# Altium footprint library ref-packages-longpad.PCBLIB: 1527 footprints (part 96 of 103)
Each footprint in its own frame and in the unit in brackets; x right, y up, seen from the top. Pads: shape width x height; smd on the part's side, far side on the other; paste and mask are expansions set on the pad; w line width, h text height; cw(c..) or ccw(c..) is an arc to the next point about the centre after c.
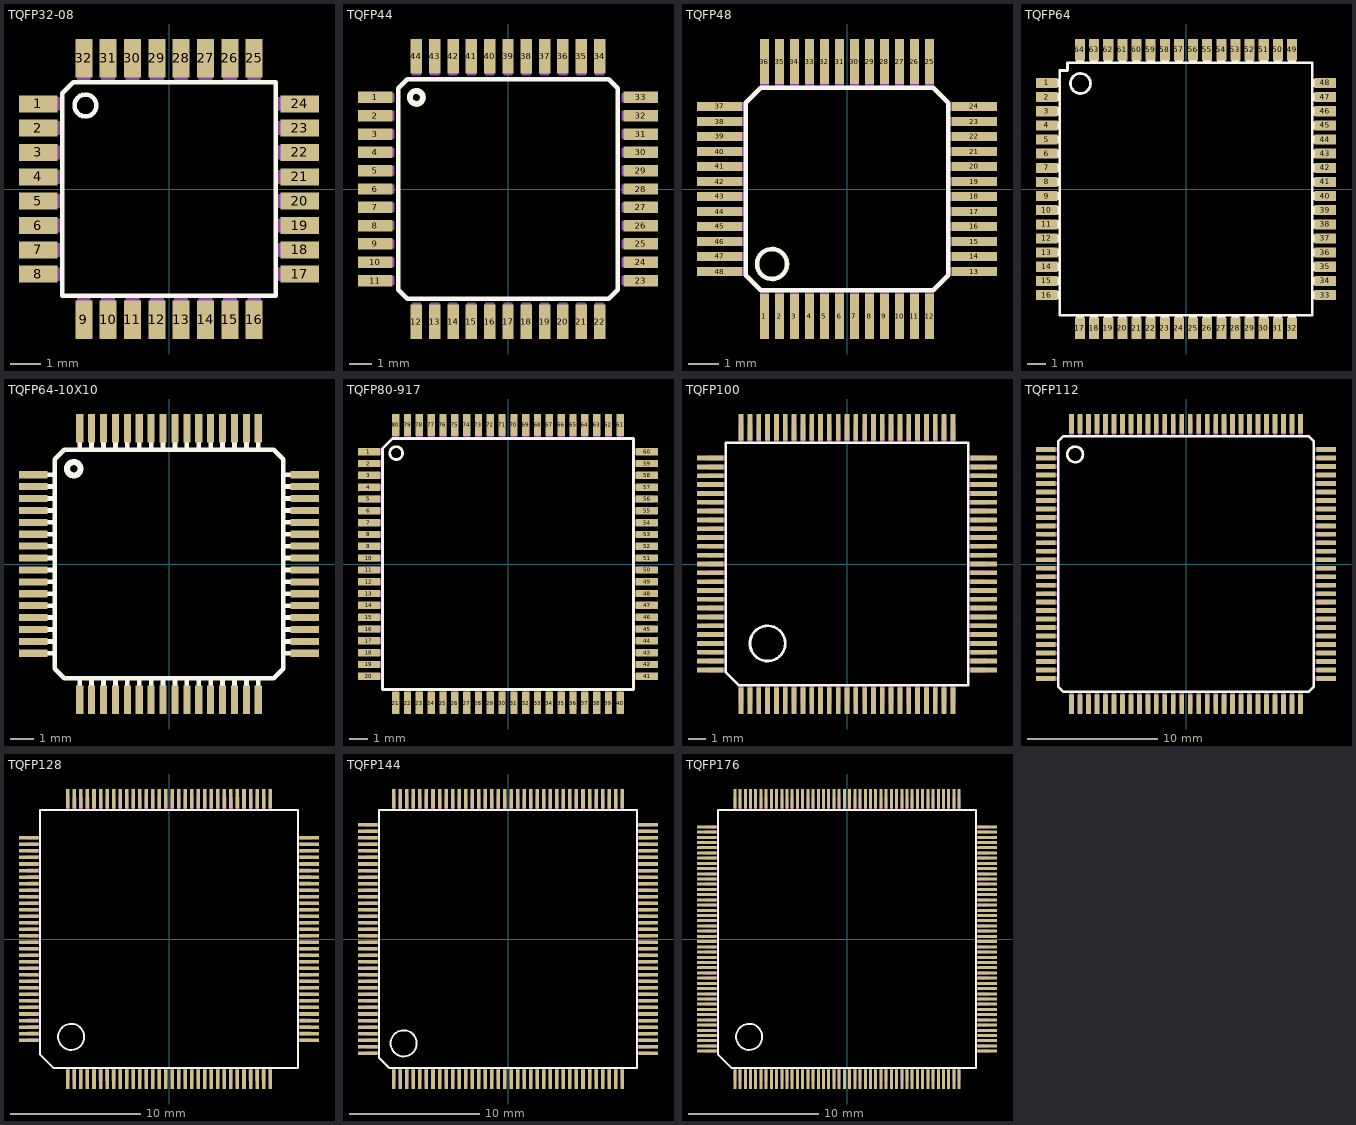
[diagram p95: the footprints below, top view; thin cyan lines are the x and y axes]

## TQFP32-08 [mil]
pads (32):
  rect 50x22 smd: 1(-169,110.24) 2(-169,78.74) 3(-169,47.24) 4(-169,15.75) 5(-169,-15.75) 6(-169,-47.24) 7(-169,-78.74) 8(-169,-110.24) 17(169,-110.24) 18(169,-78.74) 19(169,-47.24) 20(169,-15.75) 21(169,15.75) 22(169,47.24) 23(169,78.74) 24(169,110.24)
  rect 22x50 smd: 9(-110.24,-169) 10(-78.74,-169) 11(-47.24,-169) 12(-15.75,-169) 13(15.75,-169) 14(47.24,-169) 15(78.74,-169) 16(110.24,-169) 25(110.24,169) 26(78.74,169) 27(47.24,169) 28(15.75,169) 29(-15.75,169) 30(-47.24,169) 31(-78.74,169) 32(-110.24,169)
Top Overlay:
  circle w6: c-108,108 r14.14
  lines w6: -137.99,-137.99 137.99,-137.99 137.99,137.99 -124.02,137.99 -137.99,124.02 -137.99,-137.99
Mechanical 16:
  rectangle: -179,101.24 -140,119.24
  rectangle: -179,69.74 -140,87.74
  rectangle: -179,38.24 -140,56.24
  rectangle: -179,6.75 -140,24.75
  rectangle: -179,-24.75 -140,-6.75
  rectangle: -179,-56.24 -140,-38.24
  rectangle: -179,-87.74 -140,-69.74
  rectangle: -179,-119.24 -140,-101.24
  rectangle: -119.24,-179 -101.24,-140
  rectangle: -87.74,-179 -69.74,-140
  rectangle: -56.24,-179 -38.24,-140
  rectangle: -24.75,-179 -6.75,-140
  rectangle: 6.75,-179 24.75,-140
  rectangle: 38.24,-179 56.24,-140
  rectangle: 69.74,-179 87.74,-140
  rectangle: 101.24,-179 119.24,-140
  rectangle: 140,-119.24 179,-101.24
  rectangle: 140,-87.74 179,-69.74
  rectangle: 140,-56.24 179,-38.24
  rectangle: 140,-24.75 179,-6.75
  rectangle: 140,6.75 179,24.75
  rectangle: 140,38.24 179,56.24
  rectangle: 140,69.74 179,87.74
  rectangle: 140,101.24 179,119.24
  rectangle: 101.24,140 119.24,179
  rectangle: 69.74,140 87.74,179
  rectangle: 38.24,140 56.24,179
  rectangle: 6.75,140 24.75,179
  rectangle: -24.75,140 -6.75,179
  rectangle: -56.24,140 -38.24,179
  rectangle: -87.74,140 -69.74,179
  rectangle: -119.24,140 -101.24,179

## TQFP44 [mil]
pads (44):
  rect 59.06x19.69 smd: 1(-228.35,157.48) 2(-228.35,125.98) 3(-228.35,94.49) 4(-228.35,62.99) 5(-228.35,31.5) 6(-228.35,0) 7(-228.35,-31.5) 8(-228.35,-62.99) 9(-228.35,-94.49) 10(-228.35,-125.98) 11(-228.35,-157.48) 23(228.35,-157.48) 24(228.35,-125.98) 25(228.35,-94.49) 26(228.35,-62.99) 27(228.35,-31.5) 28(228.35,0) 29(228.35,31.5) 30(228.35,62.99) 31(228.35,94.49) 32(228.35,125.98) 33(228.35,157.48)
  rect 19.69x59.06 smd: 12(-157.48,-228.35) 13(-125.98,-228.35) 14(-94.49,-228.35) 15(-62.99,-228.35) 16(-31.5,-228.35) 17(0,-228.35) 18(31.5,-228.35) 19(62.99,-228.35) 20(94.49,-228.35) 21(125.98,-228.35) 22(157.48,-228.35) 34(157.48,228.35) 35(125.98,228.35) 36(94.49,228.35) 37(62.99,228.35) 38(31.5,228.35) 39(0,228.35) 40(-31.5,228.35) 41(-62.99,228.35) 42(-94.49,228.35) 43(-125.98,228.35) 44(-157.48,228.35)
Top Overlay:
  circle w10: c-157.48,157.48 r11.13
  lines w8: -188.98,-173.23 -173.23,-188.98 173.23,-188.98 188.98,-173.23 188.98,173.23 173.23,188.98 -173.23,188.98 -188.98,173.23 -188.98,-173.23
Mechanical 16:
  rectangle: -240.16,149.61 -194.88,165.35
  rectangle: -240.16,118.11 -194.88,133.86
  rectangle: -240.16,86.61 -194.88,102.36
  rectangle: -240.16,55.12 -194.88,70.87
  rectangle: -240.16,23.62 -194.88,39.37
  rectangle: -240.16,-7.87 -194.88,7.87
  rectangle: -240.16,-39.37 -194.88,-23.62
  rectangle: -240.16,-70.87 -194.88,-55.12
  rectangle: -240.16,-102.36 -194.88,-86.61
  rectangle: -240.16,-133.86 -194.88,-118.11
  rectangle: -240.16,-165.35 -194.88,-149.61
  rectangle: -165.35,-240.16 -149.61,-194.88
  rectangle: -133.86,-240.16 -118.11,-194.88
  rectangle: -102.36,-240.16 -86.61,-194.88
  rectangle: -70.87,-240.16 -55.12,-194.88
  rectangle: -39.37,-240.16 -23.62,-194.88
  rectangle: -7.87,-240.16 7.87,-194.88
  rectangle: 23.62,-240.16 39.37,-194.88
  rectangle: 55.12,-240.16 70.87,-194.88
  rectangle: 86.61,-240.16 102.36,-194.88
  rectangle: 118.11,-240.16 133.86,-194.88
  rectangle: 149.61,-240.16 165.35,-194.88
  rectangle: 194.88,-165.35 240.16,-149.61
  rectangle: 194.88,-133.86 240.16,-118.11
  rectangle: 194.88,-102.36 240.16,-86.61
  rectangle: 194.88,-70.87 240.16,-55.12
  rectangle: 194.88,-39.37 240.16,-23.62
  rectangle: 194.88,-7.87 240.16,7.87
  rectangle: 194.88,23.62 240.16,39.37
  rectangle: 194.88,55.12 240.16,70.87
  rectangle: 194.88,86.61 240.16,102.36
  rectangle: 194.88,118.11 240.16,133.86
  rectangle: 194.88,149.61 240.16,165.35
  rectangle: 149.61,194.88 165.35,240.16
  rectangle: 118.11,194.88 133.86,240.16
  rectangle: 86.61,194.88 102.36,240.16
  rectangle: 55.12,194.88 70.87,240.16
  rectangle: 23.62,194.88 39.37,240.16
  rectangle: -7.87,194.88 7.87,240.16
  rectangle: -39.37,194.88 -23.62,240.16
  rectangle: -70.87,194.88 -55.12,240.16
  rectangle: -102.36,194.88 -86.61,240.16
  rectangle: -133.86,194.88 -118.11,240.16
  rectangle: -165.35,194.88 -149.61,240.16

## TQFP48 [mil]
pads (48):
  rect 11.81x59.06 smd: 1(-108.27,-167.32) 2(-88.58,-167.32) 3(-68.9,-167.32) 4(-49.21,-167.32) 5(-29.53,-167.32) 6(-9.84,-167.32) 7(9.84,-167.32) 8(29.53,-167.32) 9(49.21,-167.32) 10(68.9,-167.32) 11(88.58,-167.32) 12(108.27,-167.32) 25(108.27,167.32) 26(88.58,167.32) 27(68.9,167.32) 28(49.21,167.32) 29(29.53,167.32) 30(9.84,167.32) 31(-9.84,167.32) 32(-29.53,167.32) 33(-49.21,167.32) 34(-68.9,167.32) 35(-88.58,167.32) 36(-108.27,167.32)
  rect 59.06x11.81 smd: 13(167.32,-108.27) 14(167.32,-88.58) 15(167.32,-68.9) 16(167.32,-49.21) 17(167.32,-29.53) 18(167.32,-9.84) 19(167.32,9.84) 20(167.32,29.53) 21(167.32,49.21) 22(167.32,68.9) 23(167.32,88.58) 24(167.32,108.27) 37(-167.32,108.27) 38(-167.32,88.58) 39(-167.32,68.9) 40(-167.32,49.21) 41(-167.32,29.53) 42(-167.32,9.84) 43(-167.32,-9.84) 44(-167.32,-29.53) 45(-167.32,-49.21) 46(-167.32,-68.9) 47(-167.32,-88.58) 48(-167.32,-108.27)
Top Overlay:
  circle w6: c-98.43,-98.43 r19.69
  lines w6: -132.8,-113.11 -113.11,-132.8 113.11,-132.8 132.8,-113.11 132.8,113.11 113.11,132.8 -113.11,132.8 -132.8,113.11 -132.8,-113.11
Mechanical 16:
  rectangle: -114.17,132.8 -102.36,172.17
  rectangle: -94.49,132.8 -82.68,172.17
  rectangle: -74.8,132.8 -62.99,172.17
  rectangle: -55.12,132.8 -43.31,172.17
  rectangle: -35.43,132.8 -23.62,172.17
  rectangle: -15.75,132.8 -3.94,172.17
  rectangle: 3.94,132.8 15.75,172.17
  rectangle: 23.62,132.8 35.43,172.17
  rectangle: 43.31,132.8 55.12,172.17
  rectangle: 62.99,132.8 74.8,172.17
  rectangle: 82.68,132.8 94.49,172.17
  rectangle: 102.36,132.8 114.17,172.17
  rectangle: 132.8,102.36 172.17,114.17
  rectangle: 132.8,82.68 172.17,94.49
  rectangle: 132.8,62.99 172.17,74.8
  rectangle: 132.8,43.31 172.17,55.12
  rectangle: 132.8,23.62 172.17,35.43
  rectangle: 132.8,3.94 172.17,15.75
  rectangle: 132.8,-15.75 172.17,-3.94
  rectangle: 132.8,-35.43 172.17,-23.62
  rectangle: 132.8,-55.12 172.17,-43.31
  rectangle: 132.8,-74.8 172.17,-62.99
  rectangle: 132.8,-94.49 172.17,-82.68
  rectangle: 132.8,-114.17 172.17,-102.36
  rectangle: 102.36,-172.17 114.17,-132.8
  rectangle: 82.68,-172.17 94.49,-132.8
  rectangle: 62.99,-172.17 74.8,-132.8
  rectangle: 43.31,-172.17 55.12,-132.8
  rectangle: 23.62,-172.17 35.43,-132.8
  rectangle: 3.94,-172.17 15.75,-132.8
  rectangle: -15.75,-172.17 -3.94,-132.8
  rectangle: -35.43,-172.17 -23.62,-132.8
  rectangle: -55.12,-172.17 -43.31,-132.8
  rectangle: -74.8,-172.17 -62.99,-132.8
  rectangle: -94.49,-172.17 -82.68,-132.8
  rectangle: -114.17,-172.17 -102.36,-132.8
  rectangle: -172.17,-114.17 -132.8,-102.36
  rectangle: -172.17,-94.49 -132.8,-82.68
  rectangle: -172.17,-55.12 -132.8,-43.31
  rectangle: -172.17,-74.8 -132.8,-62.99
  rectangle: -172.17,-15.75 -132.8,-3.94
  rectangle: -172.17,-35.43 -132.8,-23.62
  rectangle: -172.17,23.62 -132.8,35.43
  rectangle: -172.17,3.94 -132.8,15.75
  rectangle: -172.17,62.99 -132.8,74.8
  rectangle: -172.17,43.31 -132.8,55.12
  rectangle: -172.17,82.68 -132.8,94.49
  rectangle: -172.17,102.36 -132.8,114.17

## TQFP64 [mil]
pads (64):
  rect 47x22 smd: 1(-305.5,232.5) 2(-305.5,201.5) 3(-305.5,170.5) 4(-305.5,139.5) 5(-305.5,108.5) 6(-305.5,77.5) 7(-305.5,46.5) 8(-305.5,15.5) 9(-305.5,-15.5) 10(-305.5,-46.5) 11(-305.5,-77.5) 12(-305.5,-108.5) 13(-305.5,-139.5) 14(-305.5,-170.5) 15(-305.5,-201.5) 16(-305.5,-232.5) 33(305.5,-232.5) 34(305.5,-201.5) 35(305.5,-170.5) 36(305.5,-139.5) 37(305.5,-108.5) 38(305.5,-77.5) 39(305.5,-46.5) 40(305.5,-15.5) 41(305.5,15.5) 42(305.5,46.5) 43(305.5,77.5) 44(305.5,108.5) 45(305.5,139.5) 46(305.5,170.5) 47(305.5,201.5) 48(305.5,232.5)
  rect 22x47 smd: 17(-232.5,-305.5) 18(-201.5,-305.5) 19(-170.5,-305.5) 20(-139.5,-305.5) 21(-108.5,-305.5) 22(-77.5,-305.5) 23(-46.5,-305.5) 24(-15.5,-305.5) 25(15.5,-305.5) 26(46.5,-305.5) 27(77.5,-305.5) 28(108.5,-305.5) 29(139.5,-305.5) 30(170.5,-305.5) 31(201.5,-305.5) 32(232.5,-305.5) 49(232.5,305.5) 50(201.5,305.5) 51(170.5,305.5) 52(139.5,305.5) 53(108.5,305.5) 54(77.5,305.5) 55(46.5,305.5) 56(15.5,305.5) 57(-15.5,305.5) 58(-46.5,305.5) 59(-77.5,305.5) 60(-108.5,305.5) 61(-139.5,305.5) 62(-170.5,305.5) 63(-201.5,305.5) 64(-232.5,305.5)
Top Overlay:
  circle w6: c-231.5,231.5 r22
  rectangle: 279,6.5 322,24.5
  rectangle: 279,37.5 322,55.5
  rectangle: 279,68.5 322,86.5
  rectangle: 279,99.5 322,117.5
  rectangle: 279,130.5 322,148.5
  rectangle: 279,161.5 322,179.5
  rectangle: 279,192.5 322,210.5
  rectangle: 279,223.5 322,241.5
  rectangle: 279,-24.5 322,-6.5
  rectangle: 279,-55.5 322,-37.5
  rectangle: 279,-86.5 322,-68.5
  rectangle: 279,-117.5 322,-99.5
  rectangle: 279,-148.5 322,-130.5
  rectangle: 279,-179.5 322,-161.5
  rectangle: 279,-210.5 322,-192.5
  rectangle: 279,-241.5 322,-223.5
  rectangle: 6.5,-322 24.5,-279
  rectangle: 37.5,-322 55.5,-279
  rectangle: 68.5,-322 86.5,-279
  rectangle: 99.5,-322 117.5,-279
  rectangle: 130.5,-322 148.5,-279
  rectangle: 161.5,-322 179.5,-279
  rectangle: 192.5,-322 210.5,-279
  rectangle: 223.5,-322 241.5,-279
  rectangle: -24.5,-322 -6.5,-279
  rectangle: -55.5,-322 -37.5,-279
  rectangle: -86.5,-322 -68.5,-279
  rectangle: -117.5,-322 -99.5,-279
  rectangle: -148.5,-322 -130.5,-279
  rectangle: -179.5,-322 -161.5,-279
  rectangle: -210.5,-322 -192.5,-279
  rectangle: -241.5,-322 -223.5,-279
  rectangle: -322,-24.5 -279,-6.5
  rectangle: -322,-55.5 -279,-37.5
  rectangle: -322,-86.5 -279,-68.5
  rectangle: -322,-117.5 -279,-99.5
  rectangle: -322,-148.5 -279,-130.5
  rectangle: -322,-179.5 -279,-161.5
  rectangle: -322,-210.5 -279,-192.5
  rectangle: -322,-241.5 -279,-223.5
  rectangle: -322,6.5 -279,24.5
  rectangle: -322,37.5 -279,55.5
  rectangle: -322,68.5 -279,86.5
  rectangle: -322,99.5 -279,117.5
  rectangle: -322,130.5 -279,148.5
  rectangle: -322,161.5 -279,179.5
  rectangle: -322,192.5 -279,210.5
  rectangle: -322,223.5 -279,241.5
  rectangle: -24.5,279 -6.5,322
  rectangle: -55.5,279 -37.5,322
  rectangle: -86.5,279 -68.5,322
  rectangle: -117.5,279 -99.5,322
  rectangle: -148.5,279 -130.5,322
  rectangle: -179.5,279 -161.5,322
  rectangle: -210.5,279 -192.5,322
  rectangle: -241.5,279 -223.5,322
  rectangle: 6.5,279 24.5,322
  rectangle: 37.5,279 55.5,322
  rectangle: 68.5,279 86.5,322
  rectangle: 99.5,279 117.5,322
  rectangle: 130.5,279 148.5,322
  rectangle: 161.5,279 179.5,322
  rectangle: 192.5,279 210.5,322
  rectangle: 223.5,279 241.5,322
  lines w6: -277,-277 277,-277 277,277 -260,277 -260,260 -277,260 -277,-277

## TQFP64-10X10 [mm]
pads (64):
  rect 1.2x0.3 smd: 1(-5.7,3.75) 2(-5.7,3.25) 3(-5.7,2.75) 4(-5.7,2.25) 5(-5.7,1.75) 6(-5.7,1.25) 7(-5.7,0.75) 8(-5.7,0.25) 9(-5.7,-0.25) 10(-5.7,-0.75) 11(-5.7,-1.25) 12(-5.7,-1.75) 13(-5.7,-2.25) 14(-5.7,-2.75) 15(-5.7,-3.25) 16(-5.7,-3.75) 33(5.7,-3.75) 34(5.7,-3.25) 35(5.7,-2.75) 36(5.7,-2.25) 37(5.7,-1.75) 38(5.7,-1.25) 39(5.7,-0.75) 40(5.7,-0.25) 41(5.7,0.25) 42(5.7,0.75) 43(5.7,1.25) 44(5.7,1.75) 45(5.7,2.25) 46(5.7,2.75) 47(5.7,3.25) 48(5.7,3.75)
  rect 0.3x1.2 smd: 17(-3.75,-5.7) 18(-3.25,-5.7) 19(-2.75,-5.7) 20(-2.25,-5.7) 21(-1.75,-5.7) 22(-1.25,-5.7) 23(-0.75,-5.7) 24(-0.25,-5.7) 25(0.25,-5.7) 26(0.75,-5.7) 27(1.25,-5.7) 28(1.75,-5.7) 29(2.25,-5.7) 30(2.75,-5.7) 31(3.25,-5.7) 32(3.75,-5.7) 49(3.75,5.7) 50(3.25,5.7) 51(2.75,5.7) 52(2.25,5.7) 53(1.75,5.7) 54(1.25,5.7) 55(0.75,5.7) 56(0.25,5.7) 57(-0.25,5.7) 58(-0.75,5.7) 59(-1.25,5.7) 60(-1.75,5.7) 61(-2.25,5.7) 62(-2.75,5.7) 63(-3.25,5.7) 64(-3.75,5.7)
Top Overlay:
  circle w0.254: c-4,4 r0.283
  rectangle: -6,3.65 -4.8,3.85
  rectangle: -6,3.15 -4.8,3.35
  rectangle: -6,2.65 -4.8,2.85
  rectangle: -6,2.15 -4.8,2.35
  rectangle: -6,1.65 -4.8,1.85
  rectangle: -6,1.15 -4.8,1.35
  rectangle: -6,0.65 -4.8,0.85
  rectangle: -6,0.15 -4.8,0.35
  rectangle: -6,-0.35 -4.8,-0.15
  rectangle: -6,-0.85 -4.8,-0.65
  rectangle: -6,-1.35 -4.8,-1.15
  rectangle: -6,-1.85 -4.8,-1.65
  rectangle: -6,-2.35 -4.8,-2.15
  rectangle: -6,-2.85 -4.8,-2.65
  rectangle: -6,-3.35 -4.8,-3.15
  rectangle: -6,-3.85 -4.8,-3.65
  rectangle: -3.85,-6 -3.65,-4.8
  rectangle: -3.35,-6 -3.15,-4.8
  rectangle: -2.85,-6 -2.65,-4.8
  rectangle: -2.35,-6 -2.15,-4.8
  rectangle: -1.85,-6 -1.65,-4.8
  rectangle: -1.35,-6 -1.15,-4.8
  rectangle: -0.85,-6 -0.65,-4.8
  rectangle: -0.35,-6 -0.15,-4.8
  rectangle: 0.15,-6 0.35,-4.8
  rectangle: 0.65,-6 0.85,-4.8
  rectangle: 1.15,-6 1.35,-4.8
  rectangle: 1.65,-6 1.85,-4.8
  rectangle: 2.15,-6 2.35,-4.8
  rectangle: 2.65,-6 2.85,-4.8
  rectangle: 3.15,-6 3.35,-4.8
  rectangle: 3.65,-6 3.85,-4.8
  rectangle: 4.8,-3.85 6,-3.65
  rectangle: 4.8,-3.35 6,-3.15
  rectangle: 4.8,-2.85 6,-2.65
  rectangle: 4.8,-2.35 6,-2.15
  rectangle: 4.8,-1.85 6,-1.65
  rectangle: 4.8,-1.35 6,-1.15
  rectangle: 4.8,-0.85 6,-0.65
  rectangle: 4.8,-0.35 6,-0.15
  rectangle: 4.8,0.15 6,0.35
  rectangle: 4.8,0.65 6,0.85
  rectangle: 4.8,1.15 6,1.35
  rectangle: 4.8,1.65 6,1.85
  rectangle: 4.8,2.15 6,2.35
  rectangle: 4.8,2.65 6,2.85
  rectangle: 4.8,3.15 6,3.35
  rectangle: 4.8,3.65 6,3.85
  rectangle: 3.65,4.8 3.85,6
  rectangle: 3.15,4.8 3.35,6
  rectangle: 2.65,4.8 2.85,6
  rectangle: 2.15,4.8 2.35,6
  rectangle: 1.65,4.8 1.85,6
  rectangle: 1.15,4.8 1.35,6
  rectangle: 0.65,4.8 0.85,6
  rectangle: 0.15,4.8 0.35,6
  rectangle: -0.35,4.8 -0.15,6
  rectangle: -0.85,4.8 -0.65,6
  rectangle: -1.35,4.8 -1.15,6
  rectangle: -1.85,4.8 -1.65,6
  rectangle: -2.35,4.8 -2.15,6
  rectangle: -2.85,4.8 -2.65,6
  rectangle: -3.35,4.8 -3.15,6
  rectangle: -3.85,4.8 -3.65,6
  lines w0.203: -4.8,-4.4 -4.4,-4.8 4.4,-4.8 4.8,-4.4 4.8,4.4 4.4,4.8 -4.4,4.8 -4.8,4.4 -4.8,-4.4

## TQFP80-917 [mm]
pads (80):
  rect 1.2x0.4 smd: 1(-7.65,6.175) 2(-7.65,5.525) 3(-7.65,4.875) 4(-7.65,4.225) 5(-7.65,3.575) 6(-7.65,2.925) 7(-7.65,2.275) 8(-7.65,1.625) 9(-7.65,0.975) 10(-7.65,0.325) 11(-7.65,-0.325) 12(-7.65,-0.975) 13(-7.65,-1.625) 14(-7.65,-2.275) 15(-7.65,-2.925) 16(-7.65,-3.575) 17(-7.65,-4.225) 18(-7.65,-4.875) 19(-7.65,-5.525) 20(-7.65,-6.175) 41(7.65,-6.175) 42(7.65,-5.525) 43(7.65,-4.875) 44(7.65,-4.225) 45(7.65,-3.575) 46(7.65,-2.925) 47(7.65,-2.275) 48(7.65,-1.625) 49(7.65,-0.975) 50(7.65,-0.325) 51(7.65,0.325) 52(7.65,0.975) 53(7.65,1.625) 54(7.65,2.275) 55(7.65,2.925) 56(7.65,3.575) 57(7.65,4.225) 58(7.65,4.875) 59(7.65,5.525) 60(7.65,6.175)
  rect 0.4x1.2 smd: 21(-6.175,-7.65) 22(-5.525,-7.65) 23(-4.875,-7.65) 24(-4.225,-7.65) 25(-3.575,-7.65) 26(-2.925,-7.65) 27(-2.275,-7.65) 28(-1.625,-7.65) 29(-0.975,-7.65) 30(-0.325,-7.65) 31(0.325,-7.65) 32(0.975,-7.65) 33(1.625,-7.65) 34(2.275,-7.65) 35(2.925,-7.65) 36(3.575,-7.65) 37(4.225,-7.65) 38(4.875,-7.65) 39(5.525,-7.65) 40(6.175,-7.65) 61(6.175,7.65) 62(5.525,7.65) 63(4.875,7.65) 64(4.225,7.65) 65(3.575,7.65) 66(2.925,7.65) 67(2.275,7.65) 68(1.625,7.65) 69(0.975,7.65) 70(0.325,7.65) 71(-0.325,7.65) 72(-0.975,7.65) 73(-1.625,7.65) 74(-2.275,7.65) 75(-2.925,7.65) 76(-3.575,7.65) 77(-4.225,7.65) 78(-4.875,7.65) 79(-5.525,7.65) 80(-6.175,7.65)
Top Overlay:
  circle w0.152: c-6.15,6.1 r0.354
  lines w0.152: -6.9,-6.9 6.9,-6.9 6.9,6.9 -6.35,6.9 -6.9,6.35 -6.9,-6.9
Mechanical 16:
  rectangle: -8,5.995 -6.94,6.355
  rectangle: -8,5.345 -6.94,5.705
  rectangle: -8,4.695 -6.94,5.055
  rectangle: -8,4.045 -6.94,4.405
  rectangle: -8,3.395 -6.94,3.755
  rectangle: -8,2.745 -6.94,3.105
  rectangle: -8,2.095 -6.94,2.455
  rectangle: -8,1.445 -6.94,1.805
  rectangle: -8,0.795 -6.94,1.155
  rectangle: -8,0.145 -6.94,0.505
  rectangle: -8,-0.505 -6.94,-0.145
  rectangle: -8,-1.155 -6.94,-0.795
  rectangle: -8,-1.805 -6.94,-1.445
  rectangle: -8,-2.455 -6.94,-2.095
  rectangle: -8,-3.105 -6.94,-2.745
  rectangle: -8,-3.755 -6.94,-3.395
  rectangle: -8,-4.405 -6.94,-4.045
  rectangle: -8,-5.055 -6.94,-4.695
  rectangle: -8,-5.705 -6.94,-5.345
  rectangle: -8,-6.355 -6.94,-5.995
  rectangle: -6.355,-8 -5.995,-6.94
  rectangle: -5.705,-8 -5.345,-6.94
  rectangle: -5.055,-8 -4.695,-6.94
  rectangle: -4.405,-8 -4.045,-6.94
  rectangle: -3.755,-8 -3.395,-6.94
  rectangle: -3.105,-8 -2.745,-6.94
  rectangle: -2.455,-8 -2.095,-6.94
  rectangle: -1.805,-8 -1.445,-6.94
  rectangle: -1.155,-8 -0.795,-6.94
  rectangle: -0.505,-8 -0.145,-6.94
  rectangle: 0.145,-8 0.505,-6.94
  rectangle: 0.795,-8 1.155,-6.94
  rectangle: 1.445,-8 1.805,-6.94
  rectangle: 2.095,-8 2.455,-6.94
  rectangle: 2.745,-8 3.105,-6.94
  rectangle: 3.395,-8 3.755,-6.94
  rectangle: 4.045,-8 4.405,-6.94
  rectangle: 4.695,-8 5.055,-6.94
  rectangle: 5.345,-8 5.705,-6.94
  rectangle: 5.995,-8 6.355,-6.94
  rectangle: 6.94,-6.355 8,-5.995
  rectangle: 6.94,-5.705 8,-5.345
  rectangle: 6.94,-5.055 8,-4.695
  rectangle: 6.94,-4.405 8,-4.045
  rectangle: 6.94,-3.755 8,-3.395
  rectangle: 6.94,-3.105 8,-2.745
  rectangle: 6.94,-2.455 8,-2.095
  rectangle: 6.94,-1.805 8,-1.445
  rectangle: 6.94,-1.155 8,-0.795
  rectangle: 6.94,-0.505 8,-0.145
  rectangle: 6.94,0.145 8,0.505
  rectangle: 6.94,0.795 8,1.155
  rectangle: 6.94,1.445 8,1.805
  rectangle: 6.94,2.095 8,2.455
  rectangle: 6.94,2.745 8,3.105
  rectangle: 6.94,3.395 8,3.755
  rectangle: 6.94,4.045 8,4.405
  rectangle: 6.94,4.695 8,5.055
  rectangle: 6.94,5.345 8,5.705
  rectangle: 6.94,5.995 8,6.355
  rectangle: 5.995,6.94 6.355,8
  rectangle: 5.345,6.94 5.705,8
  rectangle: 4.695,6.94 5.055,8
  rectangle: 4.045,6.94 4.405,8
  rectangle: 3.395,6.94 3.755,8
  rectangle: 2.745,6.94 3.105,8
  rectangle: 2.095,6.94 2.455,8
  rectangle: 1.445,6.94 1.805,8
  rectangle: 0.795,6.94 1.155,8
  rectangle: 0.145,6.94 0.505,8
  rectangle: -0.505,6.94 -0.145,8
  rectangle: -1.155,6.94 -0.795,8
  rectangle: -1.805,6.94 -1.445,8
  rectangle: -2.455,6.94 -2.095,8
  rectangle: -3.105,6.94 -2.745,8
  rectangle: -3.755,6.94 -3.395,8
  rectangle: -4.405,6.94 -4.045,8
  rectangle: -5.055,6.94 -4.695,8
  rectangle: -5.705,6.94 -5.345,8
  rectangle: -6.355,6.94 -5.995,8

## TQFP100 [mm]
pads (100):
  rect 0.27x1.5 smd: 1(-6,-7.75) 2(-5.5,-7.75) 3(-5,-7.75) 4(-4.5,-7.75) 5(-4,-7.75) 6(-3.5,-7.75) 7(-3,-7.75) 8(-2.5,-7.75) 9(-2,-7.75) 10(-1.5,-7.75) 11(-1,-7.75) 12(-0.5,-7.75) 13(0,-7.75) 14(0.5,-7.75) 15(1,-7.75) 16(1.5,-7.75) 17(2,-7.75) 18(2.5,-7.75) 19(3,-7.75) 20(3.5,-7.75) 21(4,-7.75) 22(4.5,-7.75) 23(5,-7.75) 24(5.5,-7.75) 25(6,-7.75) 51(6,7.75) 52(5.5,7.75) 53(5,7.75) 54(4.5,7.75) 55(4,7.75) 56(3.5,7.75) 57(3,7.75) 58(2.5,7.75) 59(2,7.75) 60(1.5,7.75) 61(1,7.75) 62(0.5,7.75) 63(0,7.75) 64(-0.5,7.75) 65(-1,7.75) 66(-1.5,7.75) 67(-2,7.75) 68(-2.5,7.75) 69(-3,7.75) 70(-3.5,7.75) 71(-4,7.75) 72(-4.5,7.75) 73(-5,7.75) 74(-5.5,7.75) 75(-6,7.75)
  rect 1.5x0.27 smd: 26(7.75,-6) 27(7.75,-5.5) 28(7.75,-5) 29(7.75,-4.5) 30(7.75,-4) 31(7.75,-3.5) 32(7.75,-3) 33(7.75,-2.5) 34(7.75,-2) 35(7.75,-1.5) 36(7.75,-1) 37(7.75,-0.5) 38(7.75,0) 39(7.75,0.5) 40(7.75,1) 41(7.75,1.5) 42(7.75,2) 43(7.75,2.5) 44(7.75,3) 45(7.75,3.5) 46(7.75,4) 47(7.75,4.5) 48(7.75,5) 49(7.75,5.5) 50(7.75,6) 76(-7.75,6) 77(-7.75,5.5) 78(-7.75,5) 79(-7.75,4.5) 80(-7.75,4) 81(-7.75,3.5) 82(-7.75,3) 83(-7.75,2.5) 84(-7.75,2) 85(-7.75,1.5) 86(-7.75,1) 87(-7.75,0.5) 88(-7.75,0) 89(-7.75,-0.5) 90(-7.75,-1) 91(-7.75,-1.5) 92(-7.75,-2) 93(-7.75,-2.5) 94(-7.75,-3) 95(-7.75,-3.5) 96(-7.75,-4) 97(-7.75,-4.5) 98(-7.75,-5) 99(-7.75,-5.5) 100(-7.75,-6)
Top Overlay:
  circle w0.152: c-4.5,-4.5 r1
  lines w0.152: -6.873,-6.123 -6.123,-6.873 6.873,-6.873 6.873,6.873 -6.873,6.873 -6.873,-6.123
Mechanical 16:
  rectangle: -6.135,6.868 -5.865,7.873
  rectangle: -5.635,6.868 -5.365,7.873
  rectangle: -5.135,6.868 -4.865,7.873
  rectangle: -4.635,6.868 -4.365,7.873
  rectangle: -4.135,6.868 -3.865,7.873
  rectangle: -3.635,6.868 -3.365,7.873
  rectangle: -3.135,6.868 -2.865,7.873
  rectangle: -2.635,6.868 -2.365,7.873
  rectangle: -2.135,6.868 -1.865,7.873
  rectangle: -1.635,6.868 -1.365,7.873
  rectangle: -1.135,6.868 -0.865,7.873
  rectangle: -0.635,6.868 -0.365,7.873
  rectangle: -0.135,6.868 0.135,7.873
  rectangle: 0.365,6.868 0.635,7.873
  rectangle: 0.865,6.868 1.135,7.873
  rectangle: 1.365,6.868 1.635,7.873
  rectangle: 1.865,6.868 2.135,7.873
  rectangle: 2.365,6.868 2.635,7.873
  rectangle: 2.865,6.868 3.135,7.873
  rectangle: 3.365,6.868 3.635,7.873
  rectangle: 3.865,6.868 4.135,7.873
  rectangle: 4.365,6.868 4.635,7.873
  rectangle: 4.865,6.868 5.135,7.873
  rectangle: 5.365,6.868 5.635,7.873
  rectangle: 5.865,6.868 6.135,7.873
  rectangle: 6.873,5.865 7.878,6.135
  rectangle: 6.873,5.365 7.878,5.635
  rectangle: 6.873,4.865 7.878,5.135
  rectangle: 6.873,4.365 7.878,4.635
  rectangle: 6.873,3.865 7.878,4.135
  rectangle: 6.873,3.365 7.878,3.635
  rectangle: 6.873,2.865 7.878,3.135
  rectangle: 6.873,2.365 7.878,2.635
  rectangle: 6.873,1.865 7.878,2.135
  rectangle: 6.873,1.365 7.878,1.635
  rectangle: 6.873,0.865 7.878,1.135
  rectangle: 6.873,0.365 7.878,0.635
  rectangle: 6.873,-0.135 7.878,0.135
  rectangle: 6.873,-0.635 7.878,-0.365
  rectangle: 6.873,-1.135 7.878,-0.865
  rectangle: 6.873,-1.635 7.878,-1.365
  rectangle: 6.873,-2.135 7.878,-1.865
  rectangle: 6.873,-2.635 7.878,-2.365
  rectangle: 6.873,-3.135 7.878,-2.865
  rectangle: 6.873,-3.635 7.878,-3.365
  rectangle: 6.873,-4.135 7.878,-3.865
  rectangle: 6.873,-4.635 7.878,-4.365
  rectangle: 6.873,-5.135 7.878,-4.865
  rectangle: 6.873,-5.635 7.878,-5.365
  rectangle: 6.873,-6.135 7.878,-5.865
  rectangle: 5.865,-7.873 6.135,-6.868
  rectangle: 5.365,-7.873 5.635,-6.868
  rectangle: 4.865,-7.873 5.135,-6.868
  rectangle: 4.365,-7.873 4.635,-6.868
  rectangle: 3.865,-7.873 4.135,-6.868
  rectangle: 3.365,-7.873 3.635,-6.868
  rectangle: 2.865,-7.873 3.135,-6.868
  rectangle: 2.365,-7.873 2.635,-6.868
  rectangle: 1.865,-7.873 2.135,-6.868
  rectangle: 1.365,-7.873 1.635,-6.868
  rectangle: 0.865,-7.873 1.135,-6.868
  rectangle: 0.365,-7.873 0.635,-6.868
  rectangle: -0.135,-7.873 0.135,-6.868
  rectangle: -0.635,-7.873 -0.365,-6.868
  rectangle: -1.135,-7.873 -0.865,-6.868
  rectangle: -1.635,-7.873 -1.365,-6.868
  rectangle: -2.135,-7.873 -1.865,-6.868
  rectangle: -2.635,-7.873 -2.365,-6.868
  rectangle: -3.135,-7.873 -2.865,-6.868